# Altium footprint library my_lib.PcbLib: 121 footprints (part 1 of 8)
Each footprint in its own frame and in the unit in brackets; x right, y up, seen from the top. Pads: shape width x height; smd on the part's side, far side on the other; paste and mask are expansions set on the pad; w line width, h text height; cw(c..) or ccw(c..) is an arc to the next point about the centre after c.
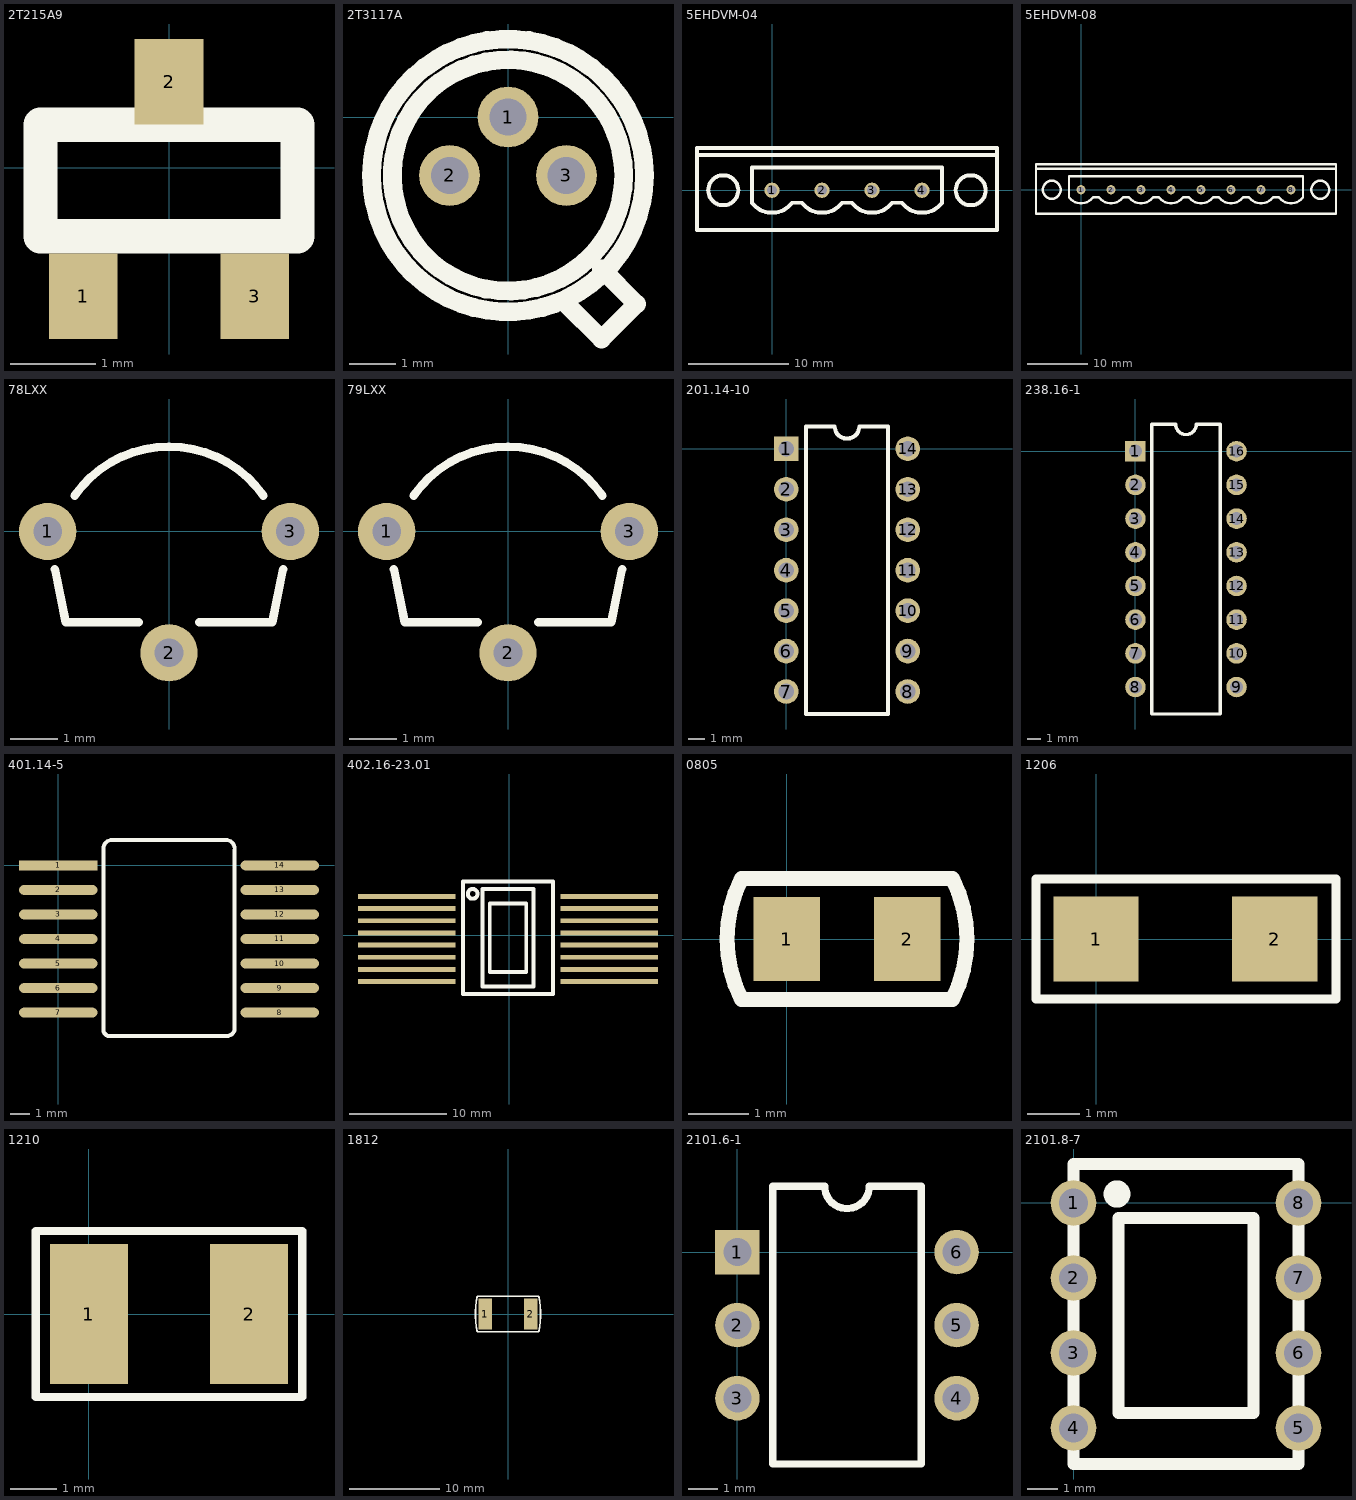
[diagram p0: the footprints below, top view; thin cyan lines are the x and y axes]

## 2Т215А9 [mm]
pads (3):
  rect 0.8x1 smd: 1(-1,-1.5) 2(0,1) 3(1,-1.5)
Top Overlay:
  lines w0.4: -1.5,-0.8 -1.5,0.5 1.5,0.5 1.5,-0.8 -1.5,-0.8

## 2Т3117А [mm]
pads (3):
  round 1.3 hole 0.8: 1(0,0) 2(-1.25,-1.25) 3(1.25,-1.25)
Top Overlay:
  circle w0.4: c0,-1.25 r2.92
  circle w0.4: c0,-1.25 r2.475
  lines w0.4: 1.25,-4 2,-4.75 2.75,-4 2,-3.25

## 5EHDVM-04 [mil]
pads (4):
  round 60 hole 38: 1(0,0) 2(196.85,0) 3(393.7,0) 4(590.55,0)
Top Overlay:
  lines w15.75: -285.43,137.8 885.83,137.8 ; -78.74,-49.21 -78.74,88.58 669.29,88.58 669.29,-49.21 ; -78.71,-49.25 ccw(c0,9.84) 78.71,-49.25 ; 78.74,-49.21 118.11,-49.21 ; 118.14,-49.25 ccw(c196.85,9.84) 275.56,-49.25 ; 275.59,-49.21 314.96,-49.21 ; 314.99,-49.25 ccw(c393.7,9.84) 472.41,-49.25 ; 472.44,-49.21 511.81,-49.21 ; 511.84,-49.25 ccw(c590.55,9.84) 669.26,-49.25 ; -295.28,-157.48 -295.28,167.32 885.83,167.32 885.83,-157.48 -295.28,-157.48 ; -250.98,0 ccw(c-191.93,0) -132.87,0 ccw(c-191.93,0) -250.98,0 ; 723.43,0 ccw(c782.48,0) 841.54,0 ccw(c782.48,0) 723.43,0

## 5EHDVM-08 [mil]
pads (8):
  round 60 hole 38: 1(0,0) 2(196.85,0) 3(393.7,0) 4(590.55,0) 5(787.4,0) 6(984.25,0) 7(1181.1,0) 8(1377.95,0)
Top Overlay:
  lines w15.75: -285.43,137.8 1673.23,137.8 ; -78.74,-49.21 -78.74,88.58 1456.69,88.58 1456.69,-49.21 ; -78.71,-49.25 ccw(c0,9.84) 78.71,-49.25 ; 78.74,-49.21 118.11,-49.21 ; 118.14,-49.25 ccw(c196.85,9.84) 275.56,-49.25 ; 275.59,-49.21 314.96,-49.21 ; 314.99,-49.25 ccw(c393.7,9.84) 472.41,-49.25 ; 472.44,-49.21 511.81,-49.21 ; 511.84,-49.25 ccw(c590.55,9.84) 669.26,-49.25 ; 669.29,-49.21 708.66,-49.21 ; 708.69,-49.25 ccw(c787.4,9.84) 866.11,-49.25 ; 866.14,-49.21 905.51,-49.21 ; 905.54,-49.25 ccw(c984.25,9.84) 1062.96,-49.25 ; 1062.99,-49.21 1102.36,-49.21 ; 1102.39,-49.25 ccw(c1181.1,9.84) 1259.81,-49.25 ; 1259.84,-49.21 1299.21,-49.21 ; 1299.24,-49.25 ccw(c1377.95,9.84) 1456.66,-49.25 ; -295.28,-157.48 -295.28,167.32 1673.23,167.32 1673.23,-157.48 -295.28,-157.48 ; -250.98,0 ccw(c-191.93,0) -132.87,0 ccw(c-191.93,0) -250.98,0 ; 1510.83,0 ccw(c1569.88,0) 1628.94,0 ccw(c1569.88,0) 1510.83,0

## 78LXX [mm]
pads (3):
  round 1.2 hole 0.6: 1(-2.54,0) 2(0,-2.54) 3(2.54,0)
Top Overlay:
  lines w0.178: -2.388,-0.787 -2.159,-1.905 -0.635,-1.905 ; -1.977,0.749 cw(c0,-0.635) 1.977,0.749 ; 0.635,-1.905 2.159,-1.905 2.388,-0.787

## 79LXX [mm]
pads (3):
  round 1.2 hole 0.6: 1(-2.54,0) 2(0,-2.54) 3(2.54,0)
Top Overlay:
  lines w0.178: -2.388,-0.787 -2.159,-1.905 -0.635,-1.905 ; -1.977,0.749 cw(c0,-0.635) 1.977,0.749 ; 0.635,-1.905 2.159,-1.905 2.388,-0.787

## 201.14-10 [mil]
pads (14):
  rect 60x60 hole 38: 1(0,0)
  round 60 hole 38: 2(0,-98.43) 3(0,-196.85) 4(0,-295.28) 5(0,-393.7) 6(0,-492.13) 7(0,-590.55) 8(295.28,-590.55) 9(295.28,-492.13) 10(295.28,-393.7) 11(295.28,-295.28) 12(295.28,-196.85) 13(295.28,-98.43) 14(295.28,0)
Top Overlay:
  lines w10: 47.64,-645.28 247.64,-645.28 247.64,54.72 177.64,54.72 cw(c147.64,54.72) 117.64,54.72 47.64,54.72 47.64,-645.28

## 238.16-1 [mil]
pads (16):
  rect 60x60 hole 38: 1(0,0)
  round 60 hole 38: 2(0,-98.43) 3(0,-196.85) 4(0,-295.28) 5(0,-393.7) 6(0,-492.13) 7(0,-590.55) 8(0,-688.98) 9(295.28,-688.98) 10(295.28,-590.55) 11(295.28,-492.13) 12(295.28,-393.7) 13(295.28,-295.28) 14(295.28,-196.85) 15(295.28,-98.43) 16(295.28,0)
Top Overlay:
  lines w10: 47.64,-767.72 47.64,78.74 117.64,78.74 ccw(c147.64,78.74) 177.64,78.74 247.64,78.74 247.64,-767.72 47.64,-767.72

## 401.14-5 [mm]
pads (14):
  rect 4x0.5 smd: 1(0,0)
  oval 4x0.5 smd: 2(0,-1.25) 3(0,-2.5) 4(0,-3.75) 5(0,-5) 6(0,-6.25) 7(0,-7.5) 8(11.3,-7.5) 9(11.3,-6.25) 10(11.3,-5) 11(11.3,-3.75) 12(11.3,-2.5) 13(11.3,-1.25) 14(11.3,0)
Top Overlay:
  lines w0.2: 2.3,-8.4 2.3,0.9 ; 2.3,-8.3 ccw(c2.65,-8.35) 2.6,-8.7 8.6,-8.7 ccw(c8.6,-8.3) 9,-8.3 9,0.8 ccw(c8.55,0.85) 8.6,1.3 2.7,1.3 ccw(c2.75,0.85) 2.3,0.8

## 402.16-23.01 [mm]
pads (16):
  rect 10x0.5 smd: 1(-10.5,4) 2(-10.5,2.75) 3(-10.5,1.5) 4(-10.5,0.25) 5(-10.5,-1) 6(-10.5,-2.25) 7(-10.5,-3.5) 8(-10.5,-4.75) 9(10.25,-4.75) 10(10.25,-3.5) 11(10.25,-2.25) 12(10.25,-1) 13(10.25,0.25) 14(10.25,1.5) 15(10.25,2.75) 16(10.25,4)
Top Overlay:
  lines w0.4: -4.75,-6 -4.75,5.5 4.5,5.5 4.5,-6 -4.75,-6 ; -4.25,4.25 ccw(c-3.75,4.25) -3.25,4.25 ccw(c-3.75,4.25) -4.25,4.25 ; -2.75,-5.25 -2.75,4.75 2.5,4.75 2.5,-5.25 -2.75,-5.25 ; -2,-3.75 -2,3.25 1.75,3.25 1.75,-3.75 -2,-3.75

## 0805 [mm]
pads (2):
  rect 1.1x1.4 smd: 1(0,0) 2(2,0)
Top Overlay:
  lines w0.25: -0.75,-1 2.75,-1 ; -0.75,1 2.75,1 ; -0.749,-1.001 cw(c1.25,0) -0.749,1.001 ; 2.749,-1.001 ccw(c0.75,0) 2.749,1.001

## 1206 [mil]
pads (2):
  rect 64x64 smd: 1(0,0) 2(134,0)
Top Overlay:
  lines w7: -45,-45 180,-45 180,45 -45,45 -45,-45

## 1210 [mm]
pads (2):
  rect 1.675x3 smd: 1(0,0) 2(3.429,0)
Top Overlay:
  lines w0.178: -1.143,-1.778 4.572,-1.778 4.572,1.778 -1.143,1.778 -1.143,-1.778

## 1812 [mm]
pads (2):
  rect 1.5x3.4 smd: 1(-2.5,0) 2(2.5,0)
Top Overlay:
  lines w0.2: -3.418,-1.906 cw(c6.481,0) -3.418,1.906 ; -3.4,-1.95 3.4,-1.95 ; -3.4,1.95 3.4,1.95 ; 3.418,-1.906 ccw(c-6.481,0) 3.418,1.906

## 2101.6-1 [mil]
pads (6):
  rect 60x60 hole 38: 1(0,0)
  round 60 hole 38: 2(0,-98.43) 3(0,-196.85) 4(295.28,-196.85) 5(295.28,-98.43) 6(295.28,0)
Top Overlay:
  lines w10: 47.64,-285.43 47.64,88.58 117.64,88.58 ccw(c147.64,88.58) 177.64,88.58 247.64,88.58 247.64,-285.43 47.64,-285.43

## 2101.8-7 [mil]
pads (8):
  round 60 hole 38: 1(0,0) 2(0,-98.43) 3(0,-196.85) 4(0,-295.28) 5(295.28,-295.28) 6(295.28,-196.85) 7(295.28,-98.43) 8(295.28,0)
Top Overlay:
  region: 51.18,23.62 47.24,7.87 55.12,0 66.93,7.87 62.99,19.68
  lines w15.75: 0,-342.52 0,51.18 295.28,51.18 295.28,-342.52 0,-342.52 ; 47.24,11.81 ccw(c57.09,11.81) 66.93,11.81 ccw(c57.09,11.81) 47.24,11.81 ; 59.06,-275.59 59.06,-19.68 236.22,-19.68 236.22,-275.59 59.06,-275.59